# Altium schematic symbol library FPGA_Xilinx_Virtex7.SchLib: 34 symbols (part 4 of 34) (continued)
## XC7V2000T-FLG1925 (continued)
part J pins: AA2 IO_L18N_T2_37 (io), AA3 IO_L18P_T2_37 (io), AA4 IO_L17N_T2_37 (io), AA5 IO_L17P_T2_37 (io), AA6 VCCO_37 (power), AA7 IO_L22N_T3_37 (io), AA8 IO_L22P_T3_37 (io), AA9 IO_L20N_T3_37 (io), AA10 IO_L20P_T3_37 (io), J1 IO_L9N_T1_DQS_38 (io), J2 VCCO_38 (power), J3 IO_L10N_T1_38 (io), J4 IO_L8N_T1_38 (io), J5 IO_L8P_T1_38 (io), K1 IO_L9P_T1_DQS_38 (io), K2 IO_L7N_T1_38 (io), K3 IO_L10P_T1_38 (io), K5 IO_L4N_T0_38 (io), K6 IO_L2N_T0_38 (io), K7 IO_L2P_T0_38 (io), K8 IO_L1N_T0_38 (io), L2 IO_L7P_T1_38 (io), L3 IO_L12N_T1_MRCC_38 (io), L4 IO_L12P_T1_MRCC_38 (io), L5 IO_L4P_T0_38 (io), L6 VCCO_38 (power), L7 IO_L6N_T0_VREF_38 (io), L8 IO_L6P_T0_38 (io), L9 IO_L1P_T0_38 (io), L10 IO_0_VRN_38 (io), M1 IO_L15N_T2_DQS_38 (io), M2 IO_L15P_T2_DQS_38 (io), M3 VCCO_38 (power), M4 IO_L11N_T1_SRCC_38 (io), M5 IO_L11P_T1_SRCC_38 (io), M6 IO_L3N_T0_DQS_38 (io), M7 IO_L3P_T0_DQS_38 (io), M9 IO_L5N_T0_38 (io), M10 IO_L5P_T0_38 (io), N1 IO_L17N_T2_38 (io), N2 IO_L17P_T2_38 (io), N3 IO_L13N_T2_MRCC_38 (io), N4 IO_L13P_T2_MRCC_38 (io), N6 IO_L20N_T3_38 (io), N7 IO_L21N_T3_DQS_38 (io), N8 IO_L19N_T3_VREF_38 (io), N9 IO_L19P_T3_38 (io), N10 VCCO_38 (power), P1 IO_L16N_T2_38 (io), P3 IO_L14N_T2_SRCC_38 (io), P4 IO_L14P_T2_SRCC_38 (io), P5 IO_L22N_T3_38 (io), P6 IO_L20P_T3_38 (io), P7 VCCO_38 (power), P8 IO_L21P_T3_DQS_38 (io), P9 IO_L23N_T3_38 (io), P10 IO_L23P_T3_38 (io), R1 IO_L16P_T2_38 (io), R2 IO_L18N_T2_38 (io), R3 IO_L18P_T2_38 (io), R4 VCCO_38 (power), R5 IO_L22P_T3_38 (io), R6 IO_L24N_T3_38 (io), R7 IO_L24P_T3_38 (io), R8 IO_L2N_T0_37 (io), R10 IO_25_VRP_38 (io), T1 VCCO_37 (power), T2 IO_L10N_T1_37 (io), T3 IO_L10P_T1_37 (io), T4 IO_L8N_T1_37 (io), T5 IO_L8P_T1_37 (io), T7 IO_L4N_T0_37 (io), T8 IO_L4P_T0_37 (io), T9 IO_L2P_T0_37 (io), T10 IO_0_VRN_37 (io), U1 IO_L7N_T1_37 (io), U2 IO_L7P_T1_37 (io), U4 IO_L12N_T1_MRCC_37 (io), U5 IO_L12P_T1_MRCC_37 (io), U6 IO_L1N_T0_37 (io), U7 IO_L1P_T0_37 (io), U8 VCCO_37 (power), U9 IO_L6N_T0_VREF_37 (io), U10 IO_L6P_T0_37 (io), V1 IO_L9N_T1_DQS_37 (io), V2 IO_L9P_T1_DQS_37 (io), V3 IO_L11N_T1_SRCC_37 (io), V4 IO_L11P_T1_SRCC_37 (io), V5 VCCO_37 (power), V6 IO_L21N_T3_DQS_37 (io), V7 IO_L3N_T0_DQS_37 (io), V8 IO_L3P_T0_DQS_37 (io), V9 IO_L5N_T0_37 (io), V10 IO_L5P_T0_37 (io), W1 IO_L16N_T2_37 (io), W2 VCCO_37 (power), W3 IO_L13N_T2_MRCC_37 (io), W4 IO_L13P_T2_MRCC_37 (io), W5 IO_L14N_T2_SRCC_37 (io), W6 IO_L21P_T3_DQS_37 (io), W8 IO_L23N_T3_37 (io), W9 IO_L19N_T3_VREF_37 (io), W10 IO_L19P_T3_37 (io), Y1 IO_L16P_T2_37 (io), Y2 IO_L15N_T2_DQS_37 (io), Y3 IO_L15P_T2_DQS_37 (io), Y5 IO_L14P_T2_SRCC_37 (io), Y6 IO_L24N_T3_37 (io), Y7 IO_L24P_T3_37 (io), Y8 IO_L23P_T3_37 (io), Y9 VCCO_37 (power), Y10 IO_25_VRP_37 (io)
part K pins: A3 IO_L18N_T2_39 (io), A4 IO_L16N_T2_39 (io), A5 IO_L16P_T2_39 (io), A6 VCCO_39 (power), A7 IO_L10N_T1_39 (io), A18 IO_L7N_T1_40 (io), A19 IO_L7P_T1_40 (io), A20 IO_L8N_T1_40 (io), B2 IO_L15N_T2_DQS_39 (io), B3 VCCO_39 (power), B4 IO_L18P_T2_39 (io), B5 IO_L9N_T1_DQS_39 (io), B6 IO_L9P_T1_DQS_39 (io), B7 IO_L10P_T1_39 (io), B19 IO_L9N_T1_DQS_40 (io), B20 IO_L8P_T1_40 (io), B21 IO_L10N_T1_40 (io), C1 IO_L17N_T2_39 (io), C2 IO_L15P_T2_DQS_39 (io), C3 IO_L13N_T2_MRCC_39 (io), C4 IO_L14N_T2_SRCC_39 (io), C6 IO_L7N_T1_39 (io), C7 IO_L7P_T1_39 (io), C8 IO_L8N_T1_39 (io), C18 IO_L11N_T1_SRCC_40 (io), C19 IO_L9P_T1_DQS_40 (io), C20 VCCO_40 (power), C21 IO_L10P_T1_40 (io), D1 IO_L17P_T2_39 (io), D3 IO_L13P_T2_MRCC_39 (io), D4 IO_L14P_T2_SRCC_39 (io), D5 IO_L11N_T1_SRCC_39 (io), D6 IO_L12N_T1_MRCC_39 (io), D7 VCCO_39 (power), D8 IO_L8P_T1_39 (io), D18 IO_L11P_T1_SRCC_40 (io), D19 IO_L12N_T1_MRCC_40 (io), D20 IO_L12P_T1_MRCC_40 (io), D21 IO_L15N_T2_DQS_40 (io), E1 IO_L23N_T3_39 (io), E2 IO_L23P_T3_39 (io), E3 IO_L21N_T3_DQS_39 (io), E4 VCCO_39 (power), E5 IO_L11P_T1_SRCC_39 (io), E6 IO_L12P_T1_MRCC_39 (io), E7 IO_L3N_T0_DQS_39 (io), E8 IO_L1N_T0_39 (io), E18 IO_L18N_T2_40 (io), E20 IO_L14N_T2_SRCC_40 (io), E21 IO_L15P_T2_DQS_40 (io), F1 VCCO_39 (power), F2 IO_L22N_T3_39 (io), F3 IO_L21P_T3_DQS_39 (io), F4 IO_L19N_T3_VREF_39 (io), F5 IO_L5N_T0_39 (io), F7 IO_L3P_T0_DQS_39 (io), F8 IO_L1P_T0_39 (io), F18 IO_L18P_T2_40 (io), F19 IO_L13N_T2_MRCC_40 (io), F20 IO_L14P_T2_SRCC_40 (io), F21 VCCO_40 (power), G1 IO_L24N_T3_39 (io), G2 IO_L22P_T3_39 (io), G4 IO_L19P_T3_39 (io), G5 IO_L5P_T0_39 (io), G6 IO_L4N_T0_39 (io), G7 IO_L4P_T0_39 (io), G8 VCCO_39 (power), G18 VCCO_40 (power), G19 IO_L13P_T2_MRCC_40 (io), G20 IO_L17N_T2_40 (io), G21 IO_L17P_T2_40 (io), H1 IO_L24P_T3_39 (io), H2 IO_L20N_T3_39 (io), H3 IO_L20P_T3_39 (io), H4 IO_25_VRP_39 (io), H5 VCCO_39 (power), H6 IO_L6N_T0_VREF_39 (io), H7 IO_L2N_T0_39 (io), H8 IO_L2P_T0_39 (io), H18 IO_L3N_T0_DQS_40 (io), H19 IO_L5N_T0_40 (io), J6 IO_L6P_T0_39 (io), J8 IO_0_VRN_39 (io), J18 IO_L3P_T0_DQS_40 (io), J19 IO_L5P_T0_40 (io), J20 IO_L16N_T2_40 (io), K17 IO_L1N_T0_40 (io), K18 IO_L2N_T0_40 (io), K19 VCCO_40 (power), K20 IO_L16P_T2_40 (io), L17 IO_L1P_T0_40 (io), L18 IO_L2P_T0_40 (io), L19 IO_L6N_T0_VREF_40 (io), L20 IO_L4N_T0_40 (io), M17 IO_0_VRN_40 (io), M19 IO_L6P_T0_40 (io), M20 IO_L4P_T0_40 (io), N17 IO_25_VRP_40 (io), N18 IO_L24N_T3_40 (io), N19 IO_L19N_T3_VREF_40 (io), N20 VCCO_40 (power), P17 VCCO_40 (power), P18 IO_L24P_T3_40 (io), P19 IO_L19P_T3_40 (io), P20 IO_L20N_T3_40 (io), R17 IO_L23N_T3_40 (io), R18 IO_L22N_T3_40 (io), R20 IO_L20P_T3_40 (io), T17 IO_L23P_T3_40 (io), T18 IO_L22P_T3_40 (io), T19 IO_L21N_T3_DQS_40 (io), T20 IO_L21P_T3_DQS_40 (io)
part L pins: A8 IO_L7N_T1_42 (io), A9 IO_L10N_T1_42 (io), A10 IO_L10P_T1_42 (io), A12 IO_L8N_T1_42 (io), A13 IO_L8N_T1_41 (io), A14 IO_L10N_T1_41 (io), A15 IO_L10P_T1_41 (io), A16 VCCO_41 (power), A17 IO_L17N_T2_41 (io), B9 IO_L7P_T1_42 (io), B10 IO_L9N_T1_DQS_42 (io), B11 IO_L9P_T1_DQS_42 (io), B12 IO_L8P_T1_42 (io), B13 VCCO_41 (power), B14 IO_L8P_T1_41 (io), B15 IO_L16N_T2_41 (io), B16 IO_L16P_T2_41 (io), B17 IO_L17P_T2_41 (io), C9 IO_L12N_T1_MRCC_42 (io), C10 VCCO_42 (power), C11 IO_L11N_T1_SRCC_42 (io), C12 IO_L11P_T1_SRCC_42 (io), C13 IO_L11N_T1_SRCC_41 (io), C14 IO_L11P_T1_SRCC_41 (io), C16 IO_L18N_T2_41 (io), C17 IO_L18P_T2_41 (io), D9 IO_L12P_T1_MRCC_42 (io), D10 IO_L14N_T2_SRCC_42 (io), D11 IO_L13N_T2_MRCC_42 (io), D13 IO_L9N_T1_DQS_41 (io), D14 IO_L12N_T1_MRCC_41 (io), D15 IO_L12P_T1_MRCC_41 (io), D16 IO_L14N_T2_SRCC_41 (io), D17 VCCO_41 (power), E10 IO_L14P_T2_SRCC_42 (io), E11 IO_L13P_T2_MRCC_42 (io), E12 IO_L15N_T2_DQS_42 (io), E13 IO_L9P_T1_DQS_41 (io), E14 VCCO_41 (power), E15 IO_L13N_T2_MRCC_41 (io), E16 IO_L14P_T2_SRCC_41 (io), E17 IO_L15N_T2_DQS_41 (io), F9 IO_L22N_T3_42 (io), F10 IO_L16N_T2_42 (io), F11 VCCO_42 (power), F12 IO_L15P_T2_DQS_42 (io), F13 IO_L7N_T1_41 (io), F14 IO_L7P_T1_41 (io), F15 IO_L13P_T2_MRCC_41 (io), F17 IO_L15P_T2_DQS_41 (io), G9 IO_L22P_T3_42 (io), G10 IO_L16P_T2_42 (io), G11 IO_L18N_T2_42 (io), G12 IO_L17N_T2_42 (io), G14 IO_L4N_T0_41 (io), G15 IO_L4P_T0_41 (io), G16 IO_L3N_T0_DQS_41 (io), G17 IO_L6N_T0_VREF_41 (io), H9 IO_L24N_T3_42 (io), H11 IO_L18P_T2_42 (io), H12 IO_L17P_T2_42 (io), H13 IO_L19N_T3_VREF_42 (io), H14 IO_L2N_T0_41 (io), H15 VCCO_41 (power), H16 IO_L3P_T0_DQS_41 (io), H17 IO_L6P_T0_41 (io), J9 IO_L24P_T3_42 (io), J10 IO_L20N_T3_42 (io), J11 IO_L23N_T3_42 (io), J12 VCCO_42 (power), J13 IO_L19P_T3_42 (io), J14 IO_L2P_T0_41 (io), J15 IO_L1N_T0_41 (io), J16 IO_L5N_T0_41 (io), K9 VCCO_42 (power), K10 IO_L20P_T3_42 (io), K11 IO_L23P_T3_42 (io), K12 IO_L21N_T3_DQS_42 (io), K13 IO_25_VRP_42 (io), K15 IO_L1P_T0_41 (io), K16 IO_L5P_T0_41 (io), L12 IO_L21P_T3_DQS_42 (io), L13 IO_0_VRN_42 (io), L14 IO_L20N_T3_41 (io), L15 IO_0_VRN_41 (io), L16 VCCO_41 (power), M11 IO_L3N_T0_DQS_42 (io), M12 IO_L5N_T0_42 (io), M13 VCCO_42 (power), M14 IO_L24N_T3_41 (io), M15 IO_L20P_T3_41 (io), M16 IO_L21N_T3_DQS_41 (io), N11 IO_L3P_T0_DQS_42 (io), N12 IO_L5P_T0_42 (io), N13 IO_L1N_T0_42 (io), N14 IO_L24P_T3_41 (io), N16 IO_L21P_T3_DQS_41 (io), P11 IO_L6N_T0_VREF_42 (io), P13 IO_L1P_T0_42 (io), P14 IO_L22N_T3_41 (io), P15 IO_L22P_T3_41 (io), P16 IO_L19N_T3_VREF_41 (io), R11 IO_L6P_T0_42 (io), R12 IO_L4N_T0_42 (io), R13 IO_L2N_T0_42 (io), R14 VCCO_41 (power), R15 IO_L23N_T3_41 (io), R16 IO_L19P_T3_41 (io), T11 VCCO_42 (power), T12 IO_L4P_T0_42 (io), T13 IO_L2P_T0_42 (io), T14 IO_25_VRP_41 (io), T15 IO_L23P_T3_41 (io)
part M pins: AP1 MGTXTXN3_113 (io), AP2 MGTXTXP3_113 (io), AP5 MGTXRXN3_113 (io), AP6 MGTXRXP3_113 (io), AR3 MGTXRXN2_113 (io), AR4 MGTXRXP2_113 (io), AR7 MGTREFCLK0N_113 (io), AR8 MGTREFCLK0P_113 (io), AT1 MGTXTXN2_113 (io), AT2 MGTXTXP2_113 (io), AT5 MGTXRXN1_113 (io), AT6 MGTXRXP1_113 (io), AU3 MGTXTXN1_113 (io), AU4 MGTXTXP1_113 (io), AU7 MGTREFCLK1N_113 (io), AU8 MGTREFCLK1P_113 (io), AV1 MGTXTXN0_113 (io), AV2 MGTXTXP0_113 (io), AV5 MGTXRXN0_113 (io), AV6 MGTXRXP0_113 (io), AW3 MGTXRXN3_112 (io), AW4 MGTXRXP3_112 (io), AW7 MGTREFCLK0N_112 (io), AW8 MGTREFCLK0P_112 (io), AY1 MGTXTXN3_112 (io), AY2 MGTXTXP3_112 (io), AY5 MGTXRXN2_112 (io), AY6 MGTXRXP2_112 (io), BA3 MGTXTXN2_112 (io), BA4 MGTXTXP2_112 (io), BA7 MGTREFCLK1N_112 (io), BA8 MGTREFCLK1P_112 (io), BB1 MGTXTXN1_112 (io), BB2 MGTXTXP1_112 (io), BB5 MGTXRXN1_112 (io), BB6 MGTXRXP1_112 (io), BC3 MGTXTXN0_112 (io), BC4 MGTXTXP0_112 (io), BD5 MGTXRXN0_112 (io), BD6 MGTXRXP0_112 (io)
part N pins: AD1 MGTXTXN3_115 (io), AD2 MGTXTXP3_115 (io), AD5 MGTXRXN3_115 (io), AD6 MGTXRXP3_115 (io), AE3 MGTXTXN2_115 (io), AE4 MGTXTXP2_115 (io), AE7 MGTXRXN2_115 (io), AE8 MGTXRXP2_115 (io), AF1 MGTXTXN1_115 (io), AF2 MGTXTXP1_115 (io), AF5 MGTXRXN1_115 (io), AF6 MGTXRXP1_115 (io), AG3 MGTXTXN0_115 (io), AG4 MGTXTXP0_115 (io), AG7 MGTREFCLK0N_115 (io), AG8 MGTREFCLK0P_115 (io), AH1 MGTXTXN3_114 (io), AH2 MGTXTXP3_114 (io), AH5 MGTXRXN0_115 (io), AH6 MGTXRXP0_115 (io), AJ3 MGTXRXN3_114 (io), AJ4 MGTXRXP3_114 (io), AJ7 MGTREFCLK1N_115 (io), AJ8 MGTREFCLK1P_115 (io), AK1 MGTXTXN2_114 (io), AK2 MGTXTXP2_114 (io), AK5 MGTXRXN2_114 (io), AK6 MGTXRXP2_114 (io), AL3 MGTXTXN1_114 (io), AL4 MGTXTXP1_114 (io), AL7 MGTREFCLK0N_114 (io), AL8 MGTREFCLK0P_114 (io), AM1 MGTXTXN0_114 (io), AM2 MGTXTXP0_114 (io), AM5 MGTXRXN1_114 (io), AM6 MGTXRXP1_114 (io), AN3 MGTXRXN0_114 (io), AN4 MGTXRXP0_114 (io), AN7 MGTREFCLK1N_114 (io), AN8 MGTREFCLK1P_114 (io)
part O pins: AD7 MGTAVCC_G11 (power), AE5 MGTAVTT_G11 (power), AF3 MGTAVTT_G11 (power), AF8 MGTAVCC_G11 (power), AF9 MGTRREF_115 (power), AF10 MGTAVTTRCAL_115 (power), AH8 MGTAVCC_G11 (power), AJ5 MGTAVTT_G11 (power), AK3 MGTAVTT_G11 (power), AK8 MGTAVCC_G11 (power), AM8 MGTVCCAUX_G11 (power), AN5 MGTAVTT_G11 (power), AP3 MGTAVTT_G10 (power), AP8 MGTVCCAUX_G10 (power), AT8 MGTAVCC_G10 (power), AU5 MGTAVTT_G10 (power), AV3 MGTAVTT_G10 (power), AV8 MGTAVCC_G10 (power), AY8 MGTAVCC_G10 (power), BA5 MGTAVTT_G10 (power), BB3 MGTAVTT_G10 (power), BB8 MGTAVCC_G10 (power), BC7 MGTRREF_112 (power), BC8 MGTAVTTRCAL_112 (power)
part P pins: AB2 CCLK_0 (io), AB3 INIT_B_0 (io), AB4 TDI_0 (io), AB5 TCK_0 (io), AB6 TMS_0 (io), AB7 TDO_0 (io), AB9 VCCO_0 (power), AB10 PROGRAM_B_0 (io), AB20 VREFN_0 (io), AB21 VP_0 (io), AC8 VCCO_0 (power), AC10 CFGBVS_0 (io), AC20 VN_0 (io), AC21 VREFP_0 (io), AD10 DONE_0 (io), AD20 DXN_0 (io), AD21 DXP_0 (io), AG10 M2_0 (io), AG11 M1_0 (io), AH11 M0_0 (io)
part Q pins: A11 GND (power), A21 GND (power), A31 GND (power), A41 GND (power), AA12 VCCINT (power), AA14 VCCINT (power), AA16 VCCAUX_IO_G6 (power), AA18 VCCINT (power), AA20 GNDADC (power), AA21 VCCADC (power), AA22 VCCBRAM (power), AA24 VCCINT (power), AA26 VCCAUX_IO_G2 (power), AA28 VCCAUX (power), AB1 VCCBATT_0 (power), AB11 VCCINT (power), AB13 VCCINT (power), AB15 VCCAUX (power), AB17 VCCAUX_IO_G6 (power), AB19 VCCINT (power), AB23 VCCINT (power), AB25 VCCINT (power), AB27 VCCAUX_IO_G2 (power), AC12 VCCINT (power), AC14 VCCINT (power), AC16 VCCAUX_IO_G5 (power), AC18 VCCINT (power), AC22 VCCBRAM (power), AC24 VCCINT (power), AC26 VCCAUX_IO_G1 (power), AC28 VCCAUX (power), AD11 VCCINT (power), AD13 VCCINT (power), AD15 VCCAUX (power), AD17 VCCAUX_IO_G5 (power), AD19 VCCINT (power), AD23 VCCINT (power), AD25 VCCINT (power), AD27 VCCAUX_IO_G1 (power), AE12 VCCINT (power), AE14 VCCINT (power), AE16 VCCAUX_IO_G5 (power), AE18 VCCINT (power), AE20 VCCINT (power), AE22 VCCBRAM (power), AE24 VCCINT (power), AE26 VCCAUX_IO_G1 (power), AE28 VCCAUX (power), AF11 VCCINT (power), AF13 VCCINT (power), AF15 VCCAUX (power), AF17 VCCAUX_IO_G4 (power), AF19 VCCINT (power), AF21 VCCBRAM (power), AF23 VCCINT (power), AF25 VCCINT (power), AF27 VCCAUX_IO_G0 (power), AG12 VCCINT (power), AG14 VCCINT (power), AG16 VCCAUX_IO_G4 (power), AG18 VCCINT (power), AG20 VCCINT (power), AG22 VCCBRAM (power), AG24 VCCINT (power), AG26 VCCAUX_IO_G0 (power), AG28 VCCAUX (power), AH13 VCCINT (power), AH15 VCCAUX (power), AH17 VCCAUX_IO_G4 (power), AH19 VCCINT (power), AH21 VCCBRAM (power), AH23 VCCINT (power), AH25 VCCINT (power), AH27 VCCAUX_IO_G0 (power), B8 GND (power), B18 GND (power), B28 GND (power), B38 GND (power), C5 GND (power), C15 GND (power), C25 GND (power), C35 GND (power), D2 GND (power), D12 GND (power), D22 GND (power), D32 GND (power), D42 GND (power), E9 GND (power), E19 GND (power), E29 GND (power), E39 GND (power), F6 GND (power), F16 GND (power), F26 GND (power), F36 GND (power), G3 GND (power), G13 GND (power), G23 GND (power), G33 GND (power), G43 GND (power), H10 GND (power), H20 GND (power), H30 GND (power), H40 GND (power), J7 GND (power), J17 GND (power), J27 GND (power), J37 GND (power), K4 GND (power), K14 GND (power), K24 GND (power), K34 GND (power), K44 GND (power), L1 GND (power), L11 GND (power), L21 GND (power), L31 GND (power), L41 GND (power), M8 GND (power), M18 GND (power), M28 GND (power), M38 GND (power), N5 GND (power), N15 GND (power), N25 GND (power), N35 GND (power), P2 GND (power), P12 GND (power), P22 GND (power), P32 GND (power), P42 GND (power), R9 GND (power), R19 GND (power), R29 GND (power), R39 GND (power), T6 GND (power), T16 GND (power), T26 GND (power), T36 GND (power), U3 GND (power), U11 GND (power), U12 VCCINT (power), U13 GND (power), U14 VCCINT (power), U15 GND (power), U16 VCCAUX_IO_G7 (power), U17 GND (power), U18 VCCINT (power), U19 GND (power), U20 VCCINT (power), U21 GND (power), U22 VCCBRAM (power), U23 GND (power), U24 VCCINT (power), U25 GND (power), U26 VCCAUX_IO_G3 (power), U27 GND (power), U28 VCCAUX (power), U33 GND (power), U43 GND (power), V11 VCCINT (power), V12 GND (power), V13 VCCINT (power), V14 GND (power), V15 VCCAUX (power), V16 GND (power), V17 VCCAUX_IO_G7 (power), V18 GND (power), V19 VCCINT (power), V20 GND (power), V21 VCCBRAM (power), V22 GND (power), V23 VCCINT (power), V24 GND (power), V25 VCCINT (power), V26 GND (power), V27 VCCAUX_IO_G3 (power), V28 GND (power), V30 GND (power), V40 GND (power), W7 GND (power), W11 GND (power), W12 VCCINT (power), W13 GND (power), W14 VCCINT (power), W15 GND (power), W16 VCCAUX_IO_G7 (power), W17 GND (power), W18 VCCINT (power), W19 GND (power), W20 VCCINT (power), W21 GND (power), W22 VCCBRAM (power), W23 GND (power), W24 VCCINT (power), W26 VCCAUX_IO_G3 (power), W28 VCCAUX (power), Y11 VCCINT (power), Y13 VCCINT (power), Y15 VCCAUX (power), Y17 VCCAUX_IO_G6 (power), Y19 VCCINT (power), Y21 VCCBRAM (power), Y23 VCCINT (power), Y25 VCCINT (power), Y27 VCCAUX_IO_G2 (power)
part R pins: AA1 GND (power), AA11 GND (power), AA13 GND (power), AA15 GND (power), AA17 GND (power), AA19 GND (power), AA23 GND (power), AA25 GND (power), AA27 GND (power), AA31 GND (power), AA41 GND (power), AB8 GND (power), AB12 GND (power), AB14 GND (power), AB16 GND (power), AB18 GND (power), AB22 GND (power), AB24 GND (power), AB26 GND (power), AB38 GND (power), AC1 GND (power), AC2 GND (power), AC3 GND (power), AC4 GND (power), AC5 GND (power), AC6 GND (power), AC7 GND (power), AC9 GND (power), AC11 GND (power), AC13 GND (power), AC15 GND (power), AC17 GND (power), AC19 GND (power), AC23 GND (power), AC25 GND (power), AC27 GND (power), AC35 GND (power), AD3 GND (power), AD4 GND (power), AD8 GND (power), AD9 GND (power), AD12 GND (power), AD14 GND (power), AD16 GND (power), AD18 GND (power), AD22 GND (power), AD24 GND (power), AD26 GND (power), AD28 GND (power), AD32 GND (power), AD42 GND (power), AE1 GND (power), AE2 GND (power), AE6 GND (power), AE9 GND (power), AE10 GND (power), AE11 GND (power), AE13 GND (power), AE15 GND (power), AE17 GND (power), AE19 GND (power), AE21 GND (power), AE23 GND (power), AE25 GND (power), AE27 GND (power), AE29 GND (power), AE39 GND (power), AF4 GND (power), AF7 GND (power), AF12 GND (power), AF14 GND (power), AF16 GND (power), AF18 GND (power), AF20 GND (power), AF22 GND (power), AF24 GND (power), AF26 GND (power), AF28 GND (power), AF36 GND (power), AG1 GND (power), AG2 GND (power), AG5 GND (power), AG6 GND (power), AG9 GND (power), AG13 GND (power), AG15 GND (power), AG17 GND (power), AG19 GND (power), AG21 GND (power), AG23 GND (power), AG25 GND (power), AG27 GND (power), AG33 GND (power), AG43 GND (power), AH3 GND (power), AH4 GND (power), AH7 GND (power), AH9 GND (power), AH10 GND (power), AH12 GND (power), AH14 GND (power), AH16 GND (power), AH18 GND (power), AH20 GND (power), AH22 GND (power), AH24 GND (power), AH26 GND (power), AH30 GND (power), AH40 GND (power), AJ1 GND (power), AJ2 GND (power), AJ6 GND (power), AJ9 GND (power), AJ17 GND (power), AJ27 GND (power), AJ37 GND (power), AK4 GND (power), AK7 GND (power), AK9 GND (power), AK14 GND (power), AK24 GND (power), AK34 GND (power), AK44 GND (power), AL1 GND (power), AL2 GND (power), AL5 GND (power), AL6 GND (power), AL9 GND (power), AL11 GND (power), AL21 GND (power), AL31 GND (power), AL41 GND (power), AM3 GND (power), AM4 GND (power), AM7 GND (power), AM9 GND (power), AM18 GND (power), AM28 GND (power), AM38 GND (power), AN1 GND (power), AN2 GND (power), AN6 GND (power), AN9 GND (power), AN15 GND (power), AN25 GND (power), AN35 GND (power), AP4 GND (power), AP7 GND (power), AP9 GND (power), AP12 GND (power), AP22 GND (power), AP32 GND (power), AP42 GND (power), AR1 GND (power), AR2 GND (power), AR5 GND (power), AR6 GND (power), AR9 GND (power), AR19 GND (power), AR29 GND (power), AR39 GND (power), AT3 GND (power), AT4 GND (power), AT7 GND (power), AT9 GND (power), AT16 GND (power), AT26 GND (power), AT36 GND (power), AU1 GND (power), AU2 GND (power), AU6 GND (power), AU9 GND (power), AU13 GND (power), AU23 GND (power), AU33 GND (power), AU43 GND (power), AV4 GND (power), AV7 GND (power), AV9 GND (power), AV10 GND (power), AV20 GND (power), AV30 GND (power), AV40 GND (power), AW1 GND (power), AW2 GND (power), AW5 GND (power), AW6 GND (power), AW9 GND (power), AW17 GND (power), AW27 GND (power), AW37 GND (power), AY3 GND (power), AY4 GND (power), AY7 GND (power), AY9 GND (power), AY14 GND (power), AY24 GND (power), AY34 GND (power), AY44 GND (power), BA1 GND (power), BA2 GND (power), BA6 GND (power), BA9 GND (power), BA11 GND (power), BA21 GND (power), BA31 GND (power), BA41 GND (power), BB4 GND (power), BB7 GND (power), BB9 GND (power), BB18 GND (power), BB28 GND (power), BB38 GND (power), BC2 GND (power), BC5 GND (power), BC6 GND (power), BC9 GND (power), BC15 GND (power), BC25 GND (power), BC35 GND (power), BD3 GND (power), BD4 GND (power), BD7 GND (power), BD8 GND (power), BD9 GND (power), BD12 GND (power), BD22 GND (power), BD32 GND (power), BD42 GND (power), W25 GND (power), W27 GND (power), W37 GND (power), Y4 GND (power), Y12 GND (power), Y14 GND (power), Y16 GND (power), Y18 GND (power), Y20 GND (power), Y22 GND (power), Y24 GND (power), Y26 GND (power), Y28 GND (power), Y34 GND (power), Y44 GND (power)

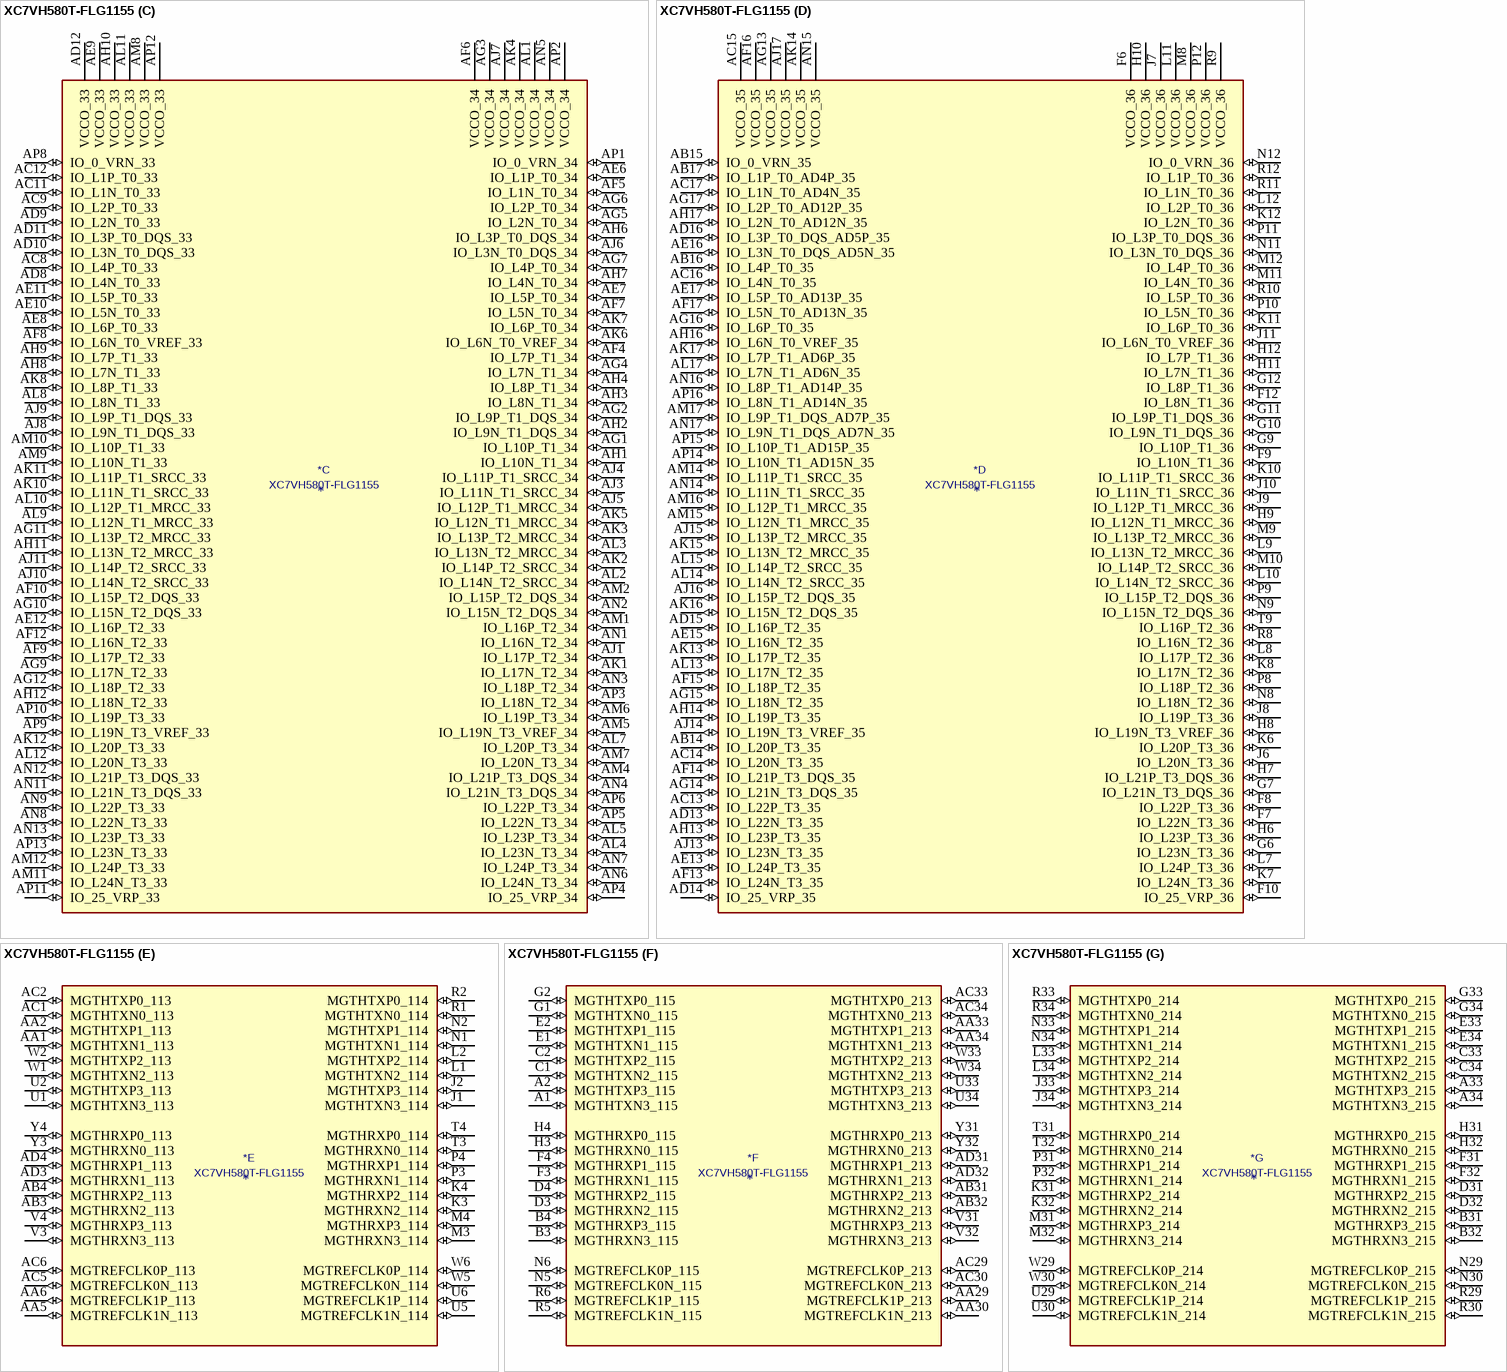
[diagram p24: symbol XC7VH580T-FLG1155]

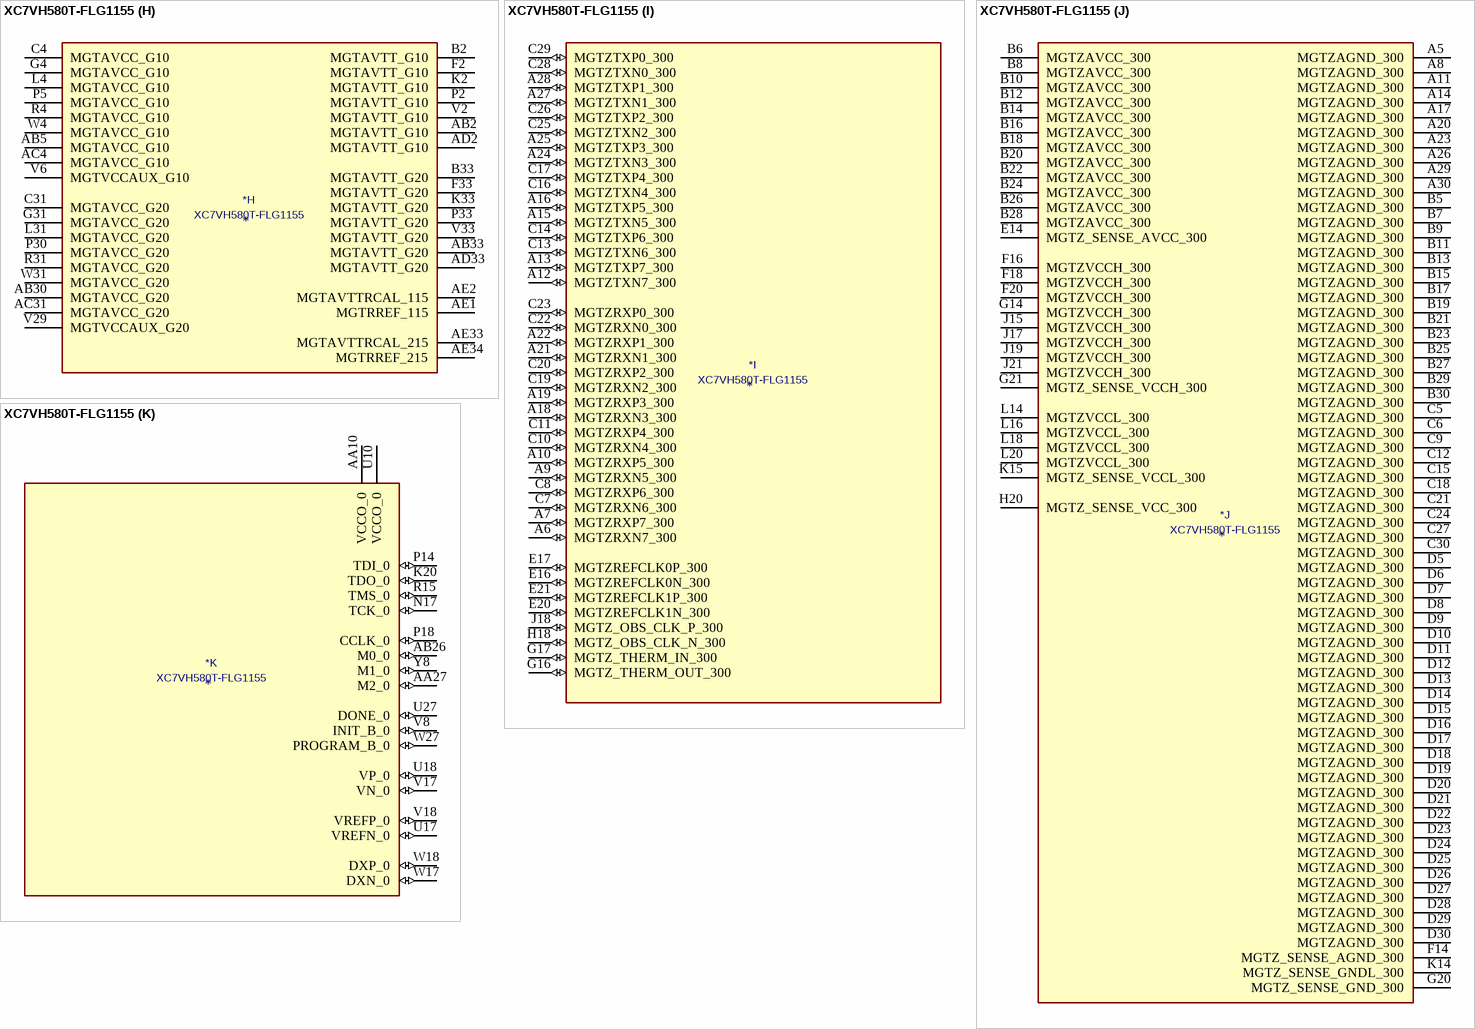
[diagram p25: symbol XC7VH580T-FLG1155]

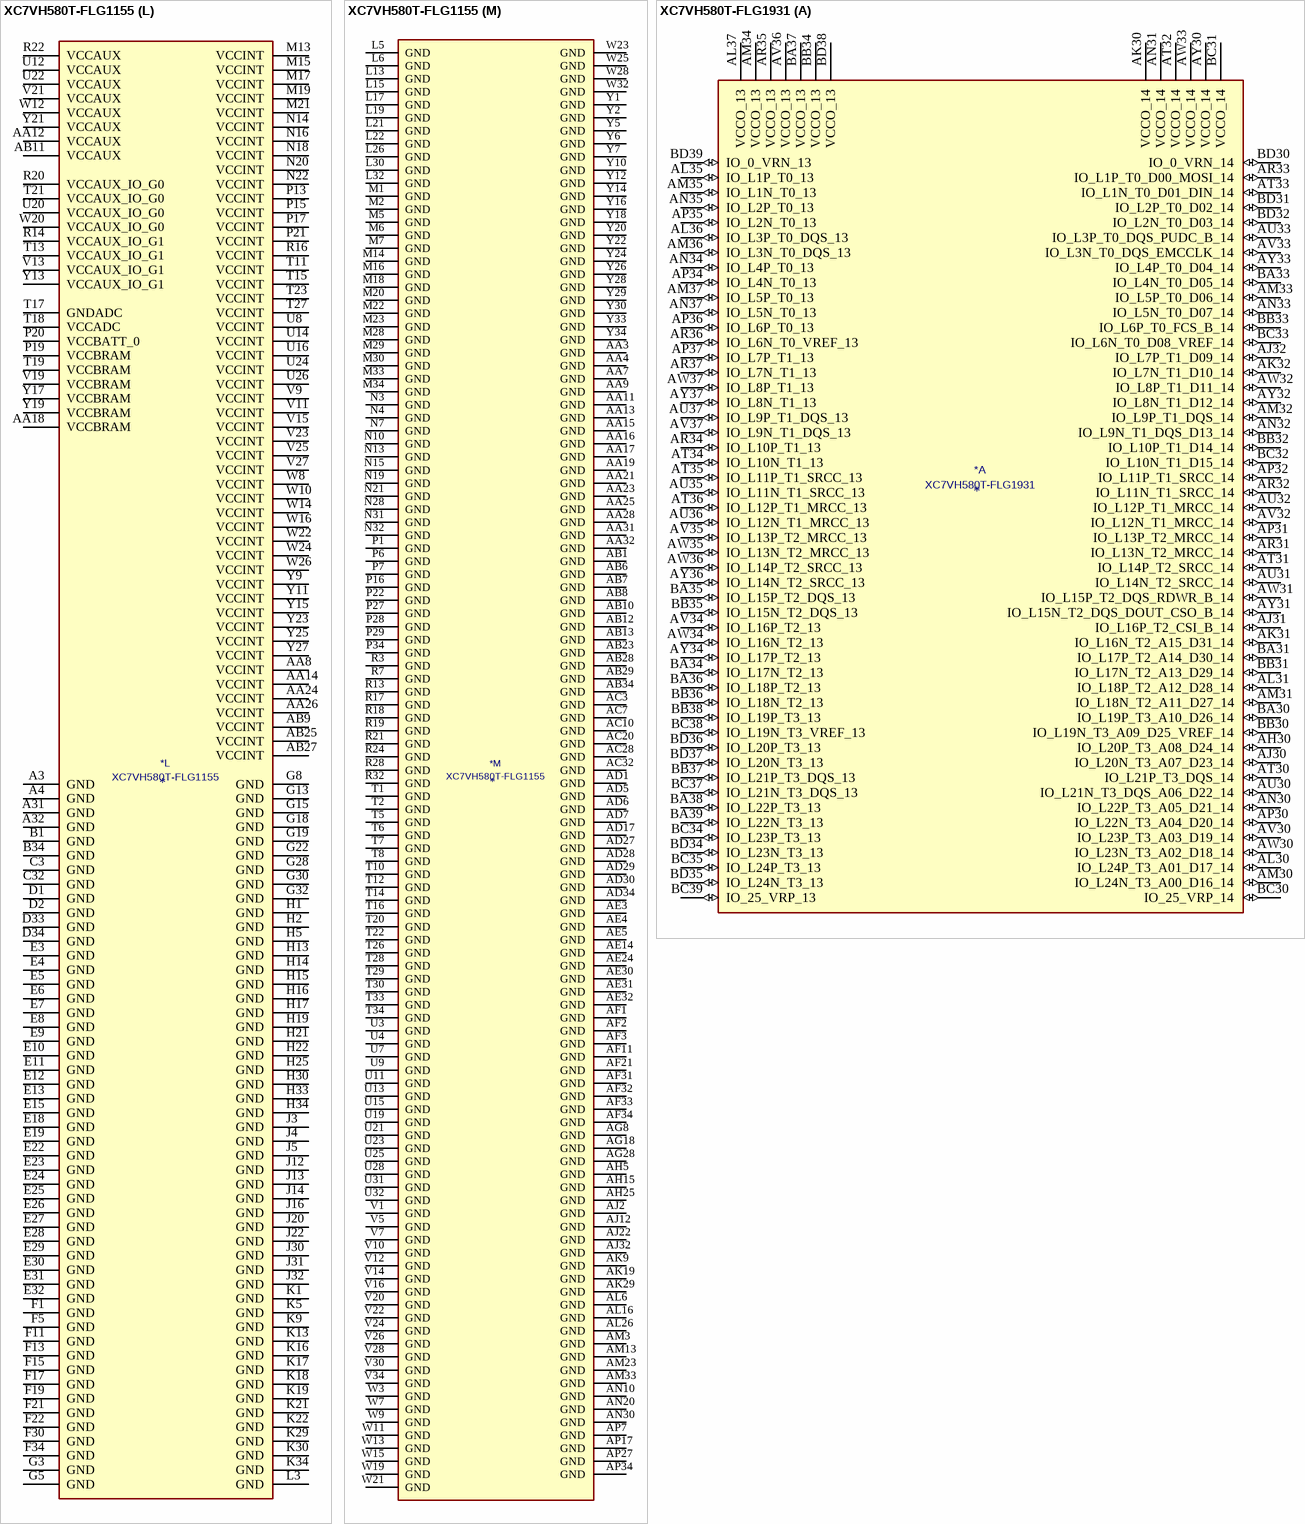
[diagram p26: symbols XC7VH580T-FLG1155 to XC7VH580T-FLG1931]